# Altium footprint library Component.PcbLib: 115 footprints (part 7 of 8)
Each footprint in its own frame and in the unit in brackets; x right, y up, seen from the top. Pads: shape width x height; smd on the part's side, far side on the other; paste and mask are expansions set on the pad; w line width, h text height; cw(c..) or ccw(c..) is an arc to the next point about the centre after c.
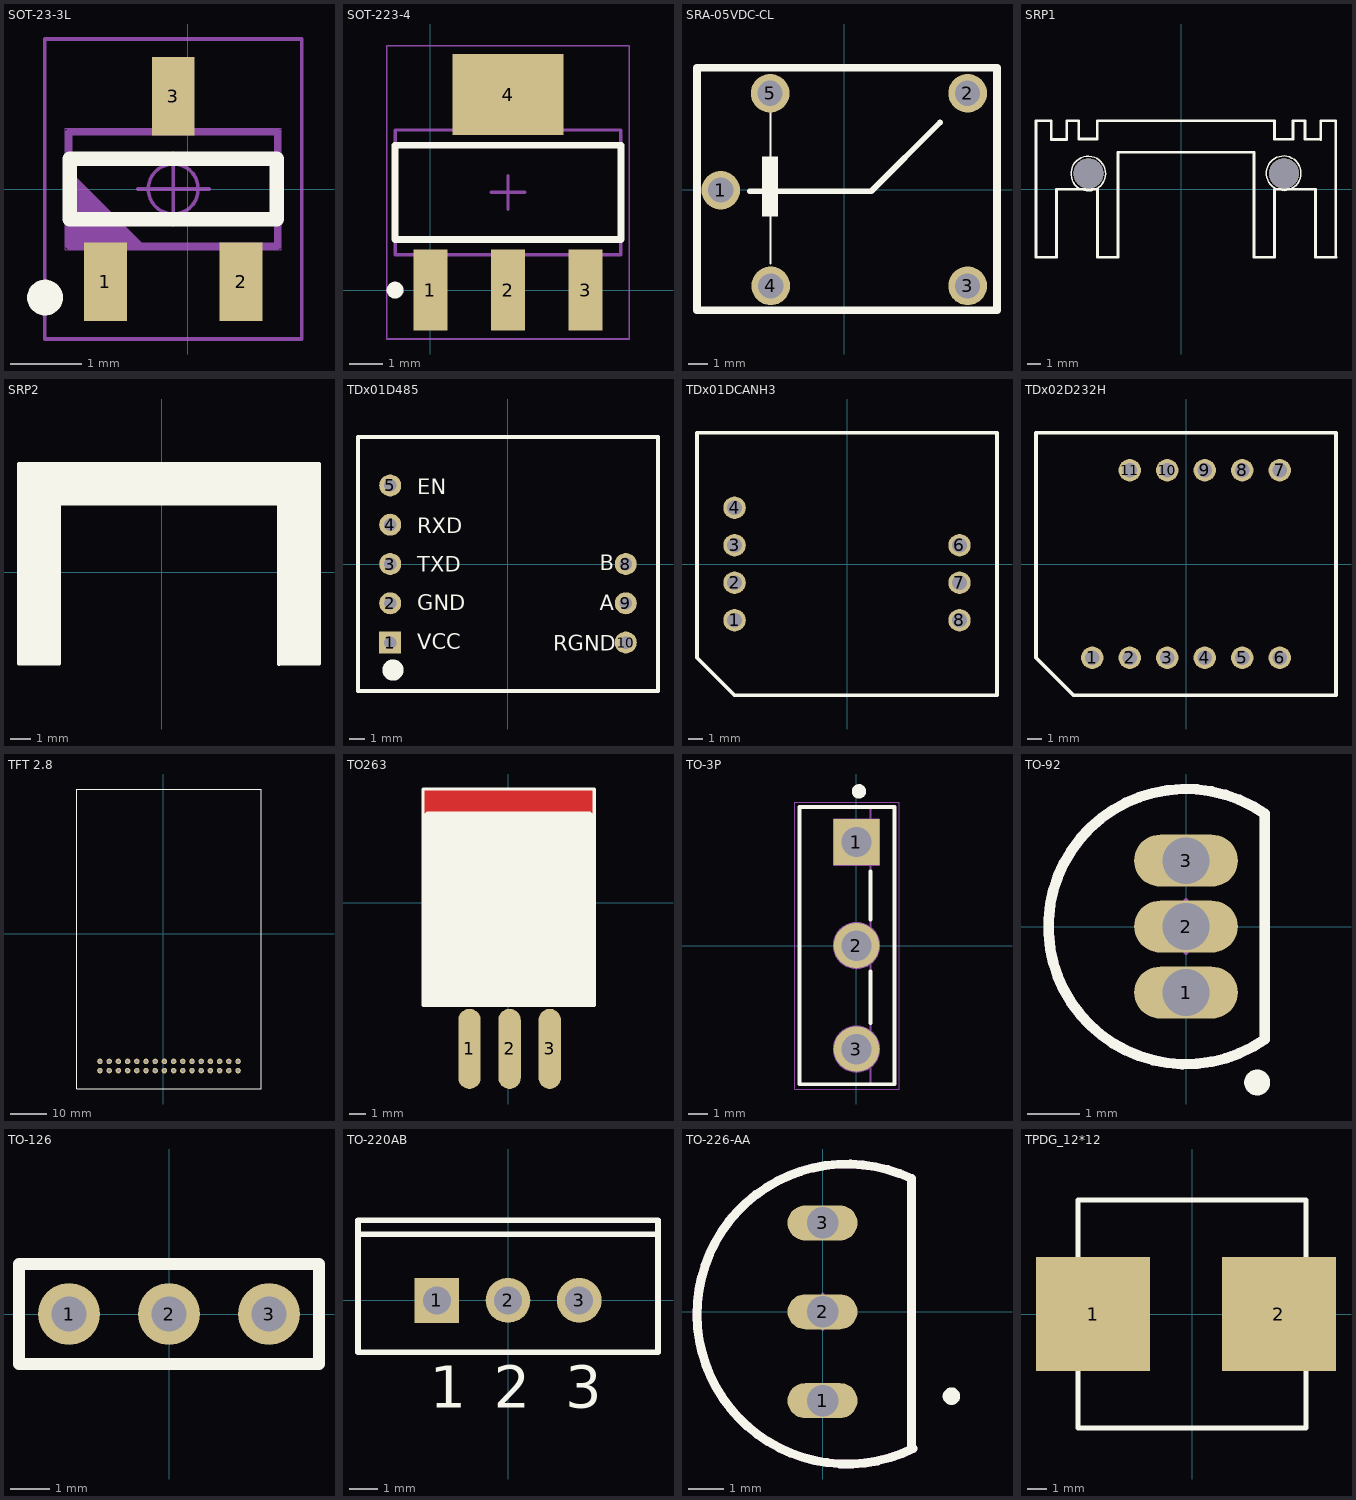
[diagram p6: the footprints below, top view; thin cyan lines are the x and y axes]

## SOT-23-3L [mm]
pads (3):
  rect 0.6x1.1 smd: 1(-1.15,-1.3) 2(0.75,-1.3) 3(-0.2,1.3)
Top Overlay:
  circle w0.25: c-1.995,-1.52 r0.125
  lines w0.2: -1.65,-0.425 -1.65,0.425 1.25,0.425 1.25,-0.425 -1.65,-0.425
Mechanical 1:
  lines w0.1: -1.66,-0.7 -1.56,-0.8 ; -1.66,-0.6 -1.46,-0.8 ; -1.66,-0.5 -1.36,-0.8 ; -1.66,-0.4 -1.26,-0.8 ; -1.66,-0.3 -1.16,-0.8 ; -1.66,-0.2 -1.06,-0.8 ; -1.66,-0.1 -0.96,-0.8 ; -1.66,0 -0.86,-0.8 ; -1.66,0.1 -0.76,-0.8 ; -1.66,0.2 -0.66,-0.8 ; -1.66,-0.8 -1.66,0.8 1.26,0.8 1.26,-0.8 -1.66,-0.8
  text "U1" at 0.214,0.36 h0.6
Mechanical 16:
  circle w0.05: c-0.2,0 r0.35
  lines w0.001: -1.71,-0.85 -1.71,0.85 1.31,0.85 1.31,-0.85 -1.71,-0.85
  lines w0.05: -0.7,0 0.3,0 ; -0.2,-0.5 -0.2,0.5 ; -2,-2.1 -2,2.1 1.6,2.1 1.6,-2.1 -2,-2.1
3D body: height 1, standoff 0, extent -1.7,-1.5 1.3,1.5

## SOT-223-4 [mm] "SOT223, 4-Leads, Body 6.50x7.00mm (avg), Pitch 2.30mm, IPC Medium Density"
height 1.8
pads (4):
  rect 1x2.4 smd: 1(0,0) 2(2.3,0) 3(4.6,0)
  rect 3.3x2.4 smd: 4(2.3,5.8)
Top Overlay:
  circle w0.25: c-1.05,0 r0.125
  lines w0.2: -1.05,1.5 -1.05,4.3 5.65,4.3 5.65,1.5 -1.05,1.5
Mechanical 13:
  lines w0.1: -1.05,1.05 -1.05,4.75 5.65,4.75 5.65,1.05 -1.05,1.05
Mechanical 15:
  lines w0.05: -1.3,-1.45 -1.3,7.25 5.9,7.25 5.9,-1.45 -1.3,-1.45
  lines w0.1: 1.8,2.9 2.8,2.9 ; 2.3,2.4 2.3,3.4
3D body: height 1.8, standoff 0.02, extent -1.05,1.05 5.65,4.75

## SRA-05VDC-CL [mm] "body:15.5mm X 12.3mm X 14mm pin 5"
pads (5):
  round 2 hole 1.3: 1(-6.38,-0.03) 2(6.38,4.98) 3(6.38,-4.98) 4(-3.8,-4.98) 5(-3.83,4.98)
Top Overlay:
  rectangle: -4.24,-1.39 -3.42,1.7
  lines w0.1: -3.82,-3.83 -3.82,3.98
  lines w0.3: -4.88,-0.09 1.4,-0.09 4.955,3.465
  lines w0.4: -7.61,-6.24 7.9,-6.24 7.9,6.3 -7.61,6.3 -7.61,-6.24

## SRP1 [mm]
via -6.8,1.13 diameter 2.2 hole 2.2
via 7.51,1.15 diameter 2.2 hole 2.2
Top Overlay:
  circle w0.1: c-6.826,1.13 r1.266
  circle w0.1: c7.484,1.16 r1.266
  lines w0.2: -9.16,-0.01 -9.16,-5 -10.66,-5 -10.66,5 -9.55,5 -9.55,3.64 -8.41,3.64 -8.4,3.65 ; -9.12,-0.01 -6.15,-0.01 -6.15,-5 ; -8.4,3.63 -8.4,5 -7.52,5 -7.52,3.67 -6.17,3.67 -6.17,4.98 ; -6.15,-1.05 -6.15,-5 ; -6.15,5 6.81,5 ; -4.66,-5 -4.66,2.69 5.31,2.69 5.31,-5 6.81,-5 6.81,-0.01 ; -4.65,-5 -6.15,-5 ; 6.82,5.01 6.82,3.65 8.17,3.65 8.17,5.01 9.05,5.01 9.05,3.65 10.19,3.65 ; 6.85,-0.01 9.82,-0.01 9.82,-5 ; 9.82,-1.05 9.82,-5 ; 10.2,3.64 10.2,5 11.31,5 11.31,-5 ; 11.32,-5 9.82,-5

## SRP2 [mm]
Top Overlay:
  rectangle: 5.86,-4.56 7.85,3.78
  rectangle: -5.33,3.43 7.85,5.39
  rectangle: -7.13,-4.56 -5.14,5.39
  lines w0.2: 5.88,-4.56 7.85,-4.56 7.85,5.39 -7.13,5.39 -7.13,-4.56 -5.14,-4.56 -5.14,3.42 5.85,3.42 ; 5.85,3.42 5.85,-4.59 5.85,3.42

## TDx01D485 [mil]
height 78.35
pads (8):
  rect 56x56 hole 32: 1(-300,-200)
  round 56 hole 32: 2(-300,-100) 3(-300,0) 4(-300,100) 5(-300,200) 8(300,0) 9(300,-100) 10(300,-200)
Top Overlay:
  circle w30: c-293,-270 r12
  lines w10: -382,-323 382,-323 382,323 -382,323 -382,-323
  text "RGND" at 115.1,-220.6 h39.37
  text "A" at 233.18,-118.24 h39.37
  text "B" at 233.18,-15.87 h39.37
  text "EN" at -231.35,177.04 h39.37
  text "RXD" at -231.35,78.61 h39.37
  text "TXD" at -231.35,-19.81 h39.37
  text "GND" at -231.35,-118.24 h39.37
  text "VCC" at -231.35,-216.66 h39.37
3D body: height 295.28, standoff -78.74, extent -400,-380.32 387.4,288.98

## TDx01DCANH3 [mil]
height 275.59
pads (7):
  round 60 hole 39.37: 1(-300,-150) 2(-300,-50) 3(-300,50) 4(-300,150) 6(300,50) 7(300,-50) 8(300,-150)
Top Overlay:
  lines w10: -400,-250 -300,-350 400,-350 400,350 -400,350 -400,-250
3D body: height 295.28, standoff -78.74, extent -400,-334.65 387.4,334.65

## TDx02D232H [mil]
height 275.59
pads (11):
  round 60 hole 39.37: 1(-250,-250) 2(-150,-250) 3(-50,-250) 4(50,-250) 5(150,-250) 6(250,-250) 7(250,250) 8(150,250) 9(50,250) 10(-50,250) 11(-150,250)
Top Overlay:
  lines w10: -400,-250 -300,-350 400,-350 400,350 -400,350 -400,-250
3D body: height 295.28, standoff -78.74, extent -392.91,-330.32 394.49,338.98

## TFT 2.8 [mil]
pads (32):
  round 60 hole 35: 1(-688.58,-1485.43) 2(-588.58,-1485.43) 3(-488.58,-1485.43) 4(-388.58,-1485.43) 5(-288.58,-1485.43) 6(-188.58,-1485.43) 7(-88.58,-1485.43) 8(11.42,-1485.43) 9(111.42,-1485.43) 10(211.42,-1485.43) 11(311.42,-1485.43) 12(411.42,-1485.43) 13(511.42,-1485.43) 14(611.42,-1485.43) 15(711.42,-1485.43) 16(811.42,-1485.43) 17(811.42,-1385.43) 18(711.42,-1385.43) 19(611.42,-1385.43) 20(511.42,-1385.43) 21(411.42,-1385.43) 22(311.42,-1385.43) 23(211.42,-1385.43) 24(111.42,-1385.43) 25(11.42,-1385.43) 26(-88.58,-1385.43) 27(-188.58,-1385.43) 28(-288.58,-1385.43) 29(-388.58,-1385.43) 30(-488.58,-1385.43) 31(-588.58,-1385.43) 32(-688.58,-1385.43)
Top Overlay:
  lines w10: -938.58,-1685.43 1061.42,-1685.43 1061.42,1574.57 -938.58,1574.57 -938.58,-1685.43

## TO263 [mm]
height 1.99
pads (3):
  oval 1.4x5 smd: 1(-2.43,-9.12) 2(0.07,-9.12) 3(2.57,-9.12)
Top Layer:
  rectangle: -5.33,3.88 5.37,7.08
Top Overlay:
  rectangle: -5.33,-6.42 5.34,5.38
  lines w0.2: -5.33,3.68 5.24,3.68 ; -5.33,4.98 -5.33,4.78 -5.33,5.31 -5.06,5.58 -4.46,5.58 4.94,5.58 ; -5.33,5.18 -4.93,5.58 -4.86,5.58 ; -5.096,5.414 5.106,5.414 ; 4.47,5.58 5.07,5.58 5.34,5.31 5.34,4.78 ; 4.87,5.58 4.94,5.58 ; 5.34,5.18 4.94,5.58 ; -5.33,-6.42 -5.33,7.08 5.34,7.08 5.34,-6.42 -5.33,-6.42
Top Solder:
  rectangle: -5.43,4.377 5.37,7.077

## TO-3P [mm]
pads (3):
  rect 2.4x2.4 / inner round 2.4 / far side rect 2.4x2.4 hole 1.6: 1(0,5.45)
  round 2.4 hole 1.6: 2(0,0) 3(0,-5.45)
Top Overlay:
  circle w0.508: c0.129,8.117 r0.125
  lines w0.2: 0.73,-4.083 0.73,-1.367 ; 0.73,1.367 0.73,3.9 ; -3,-7.3 -3,7.3 2,7.3 2,-7.3 -3,-7.3
Mechanical 15:
  circle w0.1: c0,-5.45 r1.2
  circle w0.1: c0,0 r1.2
  lines w0.1: 0.73,-7.3 0.73,7.3 ; -3,-7.3 -3,7.3 2,7.3 2,-7.3 -3,-7.3 ; -1.2,4.25 1.2,4.25 1.2,6.65 -1.2,6.65 -1.2,4.25
Mechanical 16:
  circle w0.05: c0,5.45 r0.35
  lines w0.001: -3,-7.3 -3,7.3 2,7.3 2,-7.3 -3,-7.3
  lines w0.05: -0.5,5.45 0.5,5.45 ; 0,4.95 0,5.95 ; -3.25,-7.55 -3.25,7.55 2.25,7.55 2.25,-7.55 -3.25,-7.55

## TO-92 [mm]
pads (3):
  oval 2x1 hole 0.9: 1(0,-1.27) 2(0,0) 3(0,1.27)
Top Overlay:
  circle w0.25: c1.371,-3.003 r0.125
  lines w0.2: 1.52,-2.171 cw(c0,0) 1.52,2.171 1.52,-2.171
Mechanical 13:
  lines w0.2: 1.52,-2.171 cw(c0,0) 1.52,2.171 1.52,-2.171
Mechanical 15:
  lines w0.1: -0.5,0 0.5,0 ; 0,-0.5 0,0.5
3D body: height 10.31, standoff -5.8, extent -3.15,-3.09 1.66,3.11

## TO-126 [mil]
pads (3):
  round 62 hole 35.43: 1(-100,0) 2(0,0) 3(100,0)
Top Overlay:
  lines w12: -150,-50 -150,50 150,50 150,-50 -150,-50
3D body: height 551.18, standoff -118.11, extent -156.3,-53.54 158.66,52.76

## TO-220AB [mm] "TO, Thru-Hole, Vertical, Heatsink Mounted; 3 In-Line Leads; Pitch 2.54 mm"
height 19.3
pads (3):
  rect 1.6x1.6 hole 1: 1(-2.54,0)
  round 1.6 hole 1: 2(0,0) 3(2.54,0)
Top Overlay:
  lines w0.2: -5.35,2.35 5.35,2.35 ; -5.35,-1.85 5.35,-1.85 5.35,2.85 -5.35,2.85 -5.35,-1.85
  text "2" at -0.5,-3.825 h1.5
  text "1" at -2.79,-3.825 h1.5
  text "3" at 2.04,-3.825 h1.5
3D body: height 20.86, standoff -3, extent -5.36,-1.9 5.31,2.93

## TO-226-AA [mm] "TO, Flat Index; 3 In-Line, Axial Leads; Body Dia. 4.8mm; Leads 0.55 x 0.51 mm (max)"
height 5.33
pads (3):
  oval 2x1 hole 0.9: 1(0,-2.54) 2(0,0) 3(0,2.54)
Top Overlay:
  circle w0.25: c3.685,-2.413 r0.125
  lines w0.254: 2.54,-3.81 2.54,3.81 ccw(c0.699,-0.064) 2.59,-3.913
Keep-Out Layer:
  lines w0.254: 2.54,-3.81 2.54,3.81 ccw(c0.699,-0.064) 2.59,-3.913
Mechanical 15:
  lines w0.1: -0.619,0 0.381,0 ; 0,-0.5 0,0.5

## TPDG_12*12 [mm]
pads (2):
  rect 6x6 smd: 1(-5.207,0) 2(4.572,0)
Top Overlay:
  lines w0.254: -6,-6 6,-6 6,6 -6,6 -6,-5.935
3D body: height 6.9, standoff 0.2, extent -6.18,-6.18 6.32,6.32